# Altium schematic symbol library jlcpcb_2025_04_resistors_extended_2512.schlib: 2667 symbols (part 8 of 14) (continued)
## FRL2512FR100TS
designator R?  Resistance: 100mΩ  (hidden comment: *)
Resistor, 100mΩ, ±1%, 1W, 200V, ±200ppm/℃, -55℃~+155℃, SMD 2512; Manufacturer: Uniroyal; Manufacturer Part Number: FRL2512FR100TS; Supplier 1: LCSC; Supplier Part Number 1: C2960832; JLCPCB Part Number: C2960832; Power Rating: 1W; Category: Resistors; Package Size: 2512; JLCPCB Basic Part: Yes; Tolerance: ±1%; Voltage Rating: 200V; Temperature Coefficient: ±200ppm/℃; Temperature Rating: -55℃~+155℃; ComponentLink1Description: Datasheet; ComponentLink1URL: https://wmsc.lcsc.com/wmsc/upload/file/pdf/v2/lcsc/2201181800_FOJAN-FRL2512FR100TS_C2960832.pdf; ComponentLink2Description: JLCPCB Part URL; ComponentLink2URL: https://jlcpcb.com/partdetail/C2960832
pins: 1, 2
1 alternate drawing of the same symbol

## FRL2512FR110TS
designator R?  Resistance: 110mΩ  (hidden comment: *)
Resistor, 110mΩ, ±1%, 1W, 500V, ±600ppm/℃, -55℃~+155℃, SMD 2512; Manufacturer: Uniroyal; Manufacturer Part Number: FRL2512FR110TS; Supplier 1: LCSC; Supplier Part Number 1: C2960772; JLCPCB Part Number: C2960772; Power Rating: 1W; Category: Resistors; Package Size: 2512; JLCPCB Basic Part: Yes; Tolerance: ±1%; Voltage Rating: 500V; Temperature Coefficient: ±600ppm/℃; Temperature Rating: -55℃~+155℃; ComponentLink1Description: Datasheet; ComponentLink1URL: https://wmsc.lcsc.com/wmsc/upload/file/pdf/v2/lcsc/2201181800_FOJAN-FRL2512FR110TS_C2960772.pdf; ComponentLink2Description: JLCPCB Part URL; ComponentLink2URL: https://jlcpcb.com/partdetail/C2960772
pins: 1, 2
1 alternate drawing of the same symbol

## FRL2512FR120TS
designator R?  Resistance: 120mΩ  (hidden comment: *)
Resistor, 120mΩ, ±1%, 1W, 500V, ±600ppm/℃, -55℃~+155℃, SMD 2512; Manufacturer: Uniroyal; Manufacturer Part Number: FRL2512FR120TS; Supplier 1: LCSC; Supplier Part Number 1: C2934364; JLCPCB Part Number: C2934364; Power Rating: 1W; Category: Resistors; Package Size: 2512; JLCPCB Basic Part: Yes; Tolerance: ±1%; Voltage Rating: 500V; Temperature Coefficient: ±600ppm/℃; Temperature Rating: -55℃~+155℃; ComponentLink1Description: Datasheet; ComponentLink1URL: https://wmsc.lcsc.com/wmsc/upload/file/pdf/v2/lcsc/2308241947_FOJAN-FRL2512FR120TS_C2934364.pdf; ComponentLink2Description: JLCPCB Part URL; ComponentLink2URL: https://jlcpcb.com/partdetail/C2934364
pins: 1, 2
1 alternate drawing of the same symbol

## FRL2512FR150TS
designator R?  Resistance: 150mΩ  (hidden comment: *)
Resistor, 150mΩ, ±1%, 1W, 500V, ±600ppm/℃, -55℃~+155℃, SMD 2512; Manufacturer: Uniroyal; Manufacturer Part Number: FRL2512FR150TS; Supplier 1: LCSC; Supplier Part Number 1: C2960827; JLCPCB Part Number: C2960827; Power Rating: 1W; Category: Resistors; Package Size: 2512; JLCPCB Basic Part: Yes; Tolerance: ±1%; Voltage Rating: 500V; Temperature Coefficient: ±600ppm/℃; Temperature Rating: -55℃~+155℃; ComponentLink1Description: Datasheet; ComponentLink1URL: https://wmsc.lcsc.com/wmsc/upload/file/pdf/v2/lcsc/2201181800_FOJAN-FRL2512FR150TS_C2960827.pdf; ComponentLink2Description: JLCPCB Part URL; ComponentLink2URL: https://jlcpcb.com/partdetail/C2960827
pins: 1, 2
1 alternate drawing of the same symbol

## FRL2512FR180TS
designator R?  Resistance: 180mΩ  (hidden comment: *)
Resistor, 180mΩ, ±1%, 1W, 500V, ±600ppm/℃, -55℃~+155℃, SMD 2512; Manufacturer: Uniroyal; Manufacturer Part Number: FRL2512FR180TS; Supplier 1: LCSC; Supplier Part Number 1: C2934365; JLCPCB Part Number: C2934365; Power Rating: 1W; Category: Resistors; Package Size: 2512; JLCPCB Basic Part: Yes; Tolerance: ±1%; Voltage Rating: 500V; Temperature Coefficient: ±600ppm/℃; Temperature Rating: -55℃~+155℃; ComponentLink1Description: Datasheet; ComponentLink1URL: https://wmsc.lcsc.com/wmsc/upload/file/pdf/v2/lcsc/2308241947_FOJAN-FRL2512FR180TS_C2934365.pdf; ComponentLink2Description: JLCPCB Part URL; ComponentLink2URL: https://jlcpcb.com/partdetail/C2934365
pins: 1, 2
1 alternate drawing of the same symbol

## FRL2512FR200TS
designator R?  Resistance: 200mΩ  (hidden comment: *)
Resistor, 200mΩ, ±1%, 1W, 500V, ±600ppm/℃, -55℃~+155℃, SMD 2512; Manufacturer: Uniroyal; Manufacturer Part Number: FRL2512FR200TS; Supplier 1: LCSC; Supplier Part Number 1: C2934366; JLCPCB Part Number: C2934366; Power Rating: 1W; Category: Resistors; Package Size: 2512; JLCPCB Basic Part: Yes; Tolerance: ±1%; Voltage Rating: 500V; Temperature Coefficient: ±600ppm/℃; Temperature Rating: -55℃~+155℃; ComponentLink1Description: Datasheet; ComponentLink1URL: https://wmsc.lcsc.com/wmsc/upload/file/pdf/v2/lcsc/2308241947_FOJAN-FRL2512FR200TS_C2934366.pdf; ComponentLink2Description: JLCPCB Part URL; ComponentLink2URL: https://jlcpcb.com/partdetail/C2934366
pins: 1, 2
1 alternate drawing of the same symbol

## FRL2512FR220TS
designator R?  Resistance: 220mΩ  (hidden comment: *)
Resistor, 220mΩ, ±1%, 1W, 500V, ±300ppm/℃, -55℃~+155℃, SMD 2512; Manufacturer: Uniroyal; Manufacturer Part Number: FRL2512FR220TS; Supplier 1: LCSC; Supplier Part Number 1: C2960770; JLCPCB Part Number: C2960770; Power Rating: 1W; Category: Resistors; Package Size: 2512; JLCPCB Basic Part: Yes; Tolerance: ±1%; Voltage Rating: 500V; Temperature Coefficient: ±300ppm/℃; Temperature Rating: -55℃~+155℃; ComponentLink1Description: Datasheet; ComponentLink1URL: https://wmsc.lcsc.com/wmsc/upload/file/pdf/v2/lcsc/2201181800_FOJAN-FRL2512FR220TS_C2960770.pdf; ComponentLink2Description: JLCPCB Part URL; ComponentLink2URL: https://jlcpcb.com/partdetail/C2960770
pins: 1, 2
1 alternate drawing of the same symbol

## FRL2512FR240TS
designator R?  Resistance: 240mΩ  (hidden comment: *)
Resistor, 240mΩ, ±1%, 1W, 500V, ±300ppm/℃, -55℃~+155℃, SMD 2512; Manufacturer: Uniroyal; Manufacturer Part Number: FRL2512FR240TS; Supplier 1: LCSC; Supplier Part Number 1: C2934367; JLCPCB Part Number: C2934367; Power Rating: 1W; Category: Resistors; Package Size: 2512; JLCPCB Basic Part: Yes; Tolerance: ±1%; Voltage Rating: 500V; Temperature Coefficient: ±300ppm/℃; Temperature Rating: -55℃~+155℃; ComponentLink1Description: Datasheet; ComponentLink1URL: https://wmsc.lcsc.com/wmsc/upload/file/pdf/v2/lcsc/2308241947_FOJAN-FRL2512FR240TS_C2934367.pdf; ComponentLink2Description: JLCPCB Part URL; ComponentLink2URL: https://jlcpcb.com/partdetail/C2934367
pins: 1, 2
1 alternate drawing of the same symbol

## FRL2512FR250TS
designator R?  Resistance: 250mΩ  (hidden comment: *)
Resistor, 250mΩ, ±1%, SMD 2512; Manufacturer: Uniroyal; Manufacturer Part Number: FRL2512FR250TS; Supplier 1: LCSC; Supplier Part Number 1: C3000774; JLCPCB Part Number: C3000774; Category: Resistors; Package Size: 2512; JLCPCB Basic Part: Yes; Tolerance: ±1%; ComponentLink1Description: Datasheet; ComponentLink1URL: https://wmsc.lcsc.com/wmsc/upload/file/pdf/v2/lcsc/2308241947_FOJAN-FRL2512FR250TS_C3000774.pdf; ComponentLink2Description: JLCPCB Part URL; ComponentLink2URL: https://jlcpcb.com/partdetail/C3000774
pins: 1, 2
1 alternate drawing of the same symbol

## FRL2512FR270TS
designator R?  Resistance: 270mΩ  (hidden comment: *)
Resistor, 270mΩ, ±1%, 1W, 500V, ±300ppm/℃, -55℃~+155℃, SMD 2512; Manufacturer: Uniroyal; Manufacturer Part Number: FRL2512FR270TS; Supplier 1: LCSC; Supplier Part Number 1: C2960711; JLCPCB Part Number: C2960711; Power Rating: 1W; Category: Resistors; Package Size: 2512; JLCPCB Basic Part: Yes; Tolerance: ±1%; Voltage Rating: 500V; Temperature Coefficient: ±300ppm/℃; Temperature Rating: -55℃~+155℃; ComponentLink1Description: Datasheet; ComponentLink1URL: https://wmsc.lcsc.com/wmsc/upload/file/pdf/v2/lcsc/2201181800_FOJAN-FRL2512FR270TS_C2960711.pdf; ComponentLink2Description: JLCPCB Part URL; ComponentLink2URL: https://jlcpcb.com/partdetail/C2960711
pins: 1, 2
1 alternate drawing of the same symbol

## FRL2512FR330TS
designator R?  Resistance: 330mΩ  (hidden comment: *)
Resistor, 330mΩ, ±1%, 1W, 500V, ±300ppm/℃, -55℃~+155℃, SMD 2512; Manufacturer: Uniroyal; Manufacturer Part Number: FRL2512FR330TS; Supplier 1: LCSC; Supplier Part Number 1: C2960712; JLCPCB Part Number: C2960712; Power Rating: 1W; Category: Resistors; Package Size: 2512; JLCPCB Basic Part: Yes; Tolerance: ±1%; Voltage Rating: 500V; Temperature Coefficient: ±300ppm/℃; Temperature Rating: -55℃~+155℃; ComponentLink1Description: Datasheet; ComponentLink1URL: https://wmsc.lcsc.com/wmsc/upload/file/pdf/v2/lcsc/2201181800_FOJAN-FRL2512FR330TS_C2960712.pdf; ComponentLink2Description: JLCPCB Part URL; ComponentLink2URL: https://jlcpcb.com/partdetail/C2960712
pins: 1, 2
1 alternate drawing of the same symbol

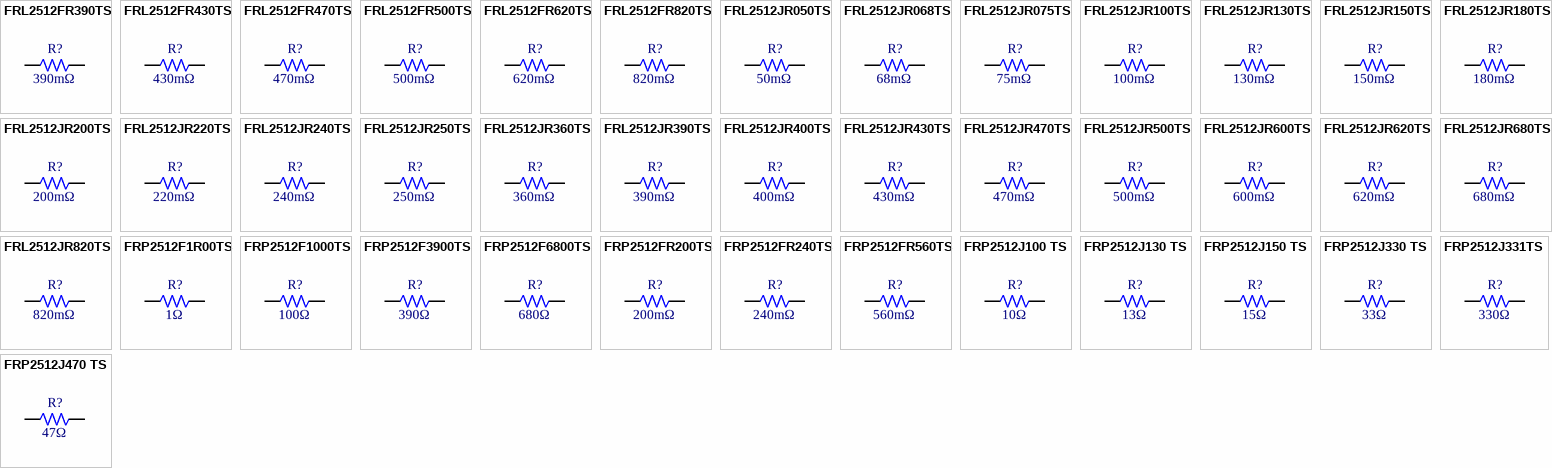
[diagram p36: symbols FRL2512FR390TS to FRP2512J470 TS]

## FRL2512FR390TS
designator R?  Resistance: 390mΩ  (hidden comment: *)
Resistor, 390mΩ, ±1%, 1W, 500V, ±300ppm/℃, -55℃~+155℃, SMD 2512; Manufacturer: Uniroyal; Manufacturer Part Number: FRL2512FR390TS; Supplier 1: LCSC; Supplier Part Number 1: C2960754; JLCPCB Part Number: C2960754; Power Rating: 1W; Category: Resistors; Package Size: 2512; JLCPCB Basic Part: Yes; Tolerance: ±1%; Voltage Rating: 500V; Temperature Coefficient: ±300ppm/℃; Temperature Rating: -55℃~+155℃; ComponentLink1Description: Datasheet; ComponentLink1URL: https://wmsc.lcsc.com/wmsc/upload/file/pdf/v2/lcsc/2201181800_FOJAN-FRL2512FR390TS_C2960754.pdf; ComponentLink2Description: JLCPCB Part URL; ComponentLink2URL: https://jlcpcb.com/partdetail/C2960754
pins: 1, 2
1 alternate drawing of the same symbol

## FRL2512FR430TS
designator R?  Resistance: 430mΩ  (hidden comment: *)
Resistor, 430mΩ, ±1%, 1W, 500V, ±300ppm/℃, -55℃~+155℃, SMD 2512; Manufacturer: Uniroyal; Manufacturer Part Number: FRL2512FR430TS; Supplier 1: LCSC; Supplier Part Number 1: C2960834; JLCPCB Part Number: C2960834; Power Rating: 1W; Category: Resistors; Package Size: 2512; JLCPCB Basic Part: Yes; Tolerance: ±1%; Voltage Rating: 500V; Temperature Coefficient: ±300ppm/℃; Temperature Rating: -55℃~+155℃; ComponentLink1Description: Datasheet; ComponentLink1URL: https://wmsc.lcsc.com/wmsc/upload/file/pdf/v2/lcsc/2201181800_FOJAN-FRL2512FR430TS_C2960834.pdf; ComponentLink2Description: JLCPCB Part URL; ComponentLink2URL: https://jlcpcb.com/partdetail/C2960834
pins: 1, 2
1 alternate drawing of the same symbol

## FRL2512FR470TS
designator R?  Resistance: 470mΩ  (hidden comment: *)
Resistor, 470mΩ, ±1%, 1W, 500V, ±300ppm/℃, -55℃~+155℃, SMD 2512; Manufacturer: Uniroyal; Manufacturer Part Number: FRL2512FR470TS; Supplier 1: LCSC; Supplier Part Number 1: C2934368; JLCPCB Part Number: C2934368; Power Rating: 1W; Category: Resistors; Package Size: 2512; JLCPCB Basic Part: Yes; Tolerance: ±1%; Voltage Rating: 500V; Temperature Coefficient: ±300ppm/℃; Temperature Rating: -55℃~+155℃; ComponentLink1Description: Datasheet; ComponentLink1URL: https://wmsc.lcsc.com/wmsc/upload/file/pdf/v2/lcsc/2308241947_FOJAN-FRL2512FR470TS_C2934368.pdf; ComponentLink2Description: JLCPCB Part URL; ComponentLink2URL: https://jlcpcb.com/partdetail/C2934368
pins: 1, 2
1 alternate drawing of the same symbol

## FRL2512FR500TS
designator R?  Resistance: 500mΩ  (hidden comment: *)
Resistor, 500mΩ, ±1%, 1W, 500V, ±300ppm/℃, -55℃~+155℃, SMD 2512; Manufacturer: Uniroyal; Manufacturer Part Number: FRL2512FR500TS; Supplier 1: LCSC; Supplier Part Number 1: C2934369; JLCPCB Part Number: C2934369; Power Rating: 1W; Category: Resistors; Package Size: 2512; JLCPCB Basic Part: Yes; Tolerance: ±1%; Voltage Rating: 500V; Temperature Coefficient: ±300ppm/℃; Temperature Rating: -55℃~+155℃; ComponentLink1Description: Datasheet; ComponentLink1URL: https://wmsc.lcsc.com/wmsc/upload/file/pdf/v2/lcsc/2308241947_FOJAN-FRL2512FR500TS_C2934369.pdf; ComponentLink2Description: JLCPCB Part URL; ComponentLink2URL: https://jlcpcb.com/partdetail/C2934369
pins: 1, 2
1 alternate drawing of the same symbol

## FRL2512FR620TS
designator R?  Resistance: 620mΩ  (hidden comment: *)
Resistor, 620mΩ, ±1%, 1W, ±200ppm/℃, SMD 2512; Manufacturer: Uniroyal; Manufacturer Part Number: FRL2512FR620TS; Supplier 1: LCSC; Supplier Part Number 1: C5126252; JLCPCB Part Number: C5126252; Power Rating: 1W; Category: Resistors; Package Size: 2512; JLCPCB Basic Part: Yes; Tolerance: ±1%; Temperature Coefficient: ±200ppm/℃; ComponentLink1Description: Datasheet; ComponentLink1URL: https://wmsc.lcsc.com/wmsc/upload/file/pdf/v2/lcsc/2308241947_FOJAN-FRL2512FR620TS_C5126252.pdf; ComponentLink2Description: JLCPCB Part URL; ComponentLink2URL: https://jlcpcb.com/partdetail/C5126252
pins: 1, 2
1 alternate drawing of the same symbol

## FRL2512FR820TS
designator R?  Resistance: 820mΩ  (hidden comment: *)
Resistor, 820mΩ, ±1%, 1W, 500V, ±200ppm/℃, -55℃~+155℃, SMD 2512; Manufacturer: Uniroyal; Manufacturer Part Number: FRL2512FR820TS; Supplier 1: LCSC; Supplier Part Number 1: C2960726; JLCPCB Part Number: C2960726; Power Rating: 1W; Category: Resistors; Package Size: 2512; JLCPCB Basic Part: Yes; Tolerance: ±1%; Voltage Rating: 500V; Temperature Coefficient: ±200ppm/℃; Temperature Rating: -55℃~+155℃; ComponentLink1Description: Datasheet; ComponentLink1URL: https://wmsc.lcsc.com/wmsc/upload/file/pdf/v2/lcsc/2201181800_FOJAN-FRL2512FR820TS_C2960726.pdf; ComponentLink2Description: JLCPCB Part URL; ComponentLink2URL: https://jlcpcb.com/partdetail/C2960726
pins: 1, 2
1 alternate drawing of the same symbol

## FRL2512JR050TS
designator R?  Resistance: 50mΩ  (hidden comment: *)
Resistor, 50mΩ, ±5%, 1W, 500V, ±1200ppm/℃, SMD 2512; Manufacturer: Uniroyal; Manufacturer Part Number: FRL2512JR050TS; Supplier 1: LCSC; Supplier Part Number 1: C3000641; JLCPCB Part Number: C3000641; Power Rating: 1W; Category: Resistors; Package Size: 2512; JLCPCB Basic Part: Yes; Tolerance: ±5%; Voltage Rating: 500V; Temperature Coefficient: ±1200ppm/℃; ComponentLink1Description: Datasheet; ComponentLink1URL: https://wmsc.lcsc.com/wmsc/upload/file/pdf/v2/lcsc/2308241947_FOJAN-FRL2512JR050TS_C3000641.pdf; ComponentLink2Description: JLCPCB Part URL; ComponentLink2URL: https://jlcpcb.com/partdetail/C3000641
pins: 1, 2
1 alternate drawing of the same symbol

## FRL2512JR068TS
designator R?  Resistance: 68mΩ  (hidden comment: *)
Resistor, 68mΩ, ±5%, 1W, 500V, ±600ppm/℃, SMD 2512; Manufacturer: Uniroyal; Manufacturer Part Number: FRL2512JR068TS; Supplier 1: LCSC; Supplier Part Number 1: C3000683; JLCPCB Part Number: C3000683; Power Rating: 1W; Category: Resistors; Package Size: 2512; JLCPCB Basic Part: Yes; Tolerance: ±5%; Voltage Rating: 500V; Temperature Coefficient: ±600ppm/℃; ComponentLink1Description: Datasheet; ComponentLink1URL: https://wmsc.lcsc.com/wmsc/upload/file/pdf/v2/lcsc/2308241947_FOJAN-FRL2512JR068TS_C3000683.pdf; ComponentLink2Description: JLCPCB Part URL; ComponentLink2URL: https://jlcpcb.com/partdetail/C3000683
pins: 1, 2
1 alternate drawing of the same symbol

## FRL2512JR075TS
designator R?  Resistance: 75mΩ  (hidden comment: *)
Resistor, 75mΩ, ±5%, 1W, 500V, ±600ppm/℃, SMD 2512; Manufacturer: Uniroyal; Manufacturer Part Number: FRL2512JR075TS; Supplier 1: LCSC; Supplier Part Number 1: C3000715; JLCPCB Part Number: C3000715; Power Rating: 1W; Category: Resistors; Package Size: 2512; JLCPCB Basic Part: Yes; Tolerance: ±5%; Voltage Rating: 500V; Temperature Coefficient: ±600ppm/℃; ComponentLink1Description: Datasheet; ComponentLink1URL: https://wmsc.lcsc.com/wmsc/upload/file/pdf/v2/lcsc/2308241947_FOJAN-FRL2512JR075TS_C3000715.pdf; ComponentLink2Description: JLCPCB Part URL; ComponentLink2URL: https://jlcpcb.com/partdetail/C3000715
pins: 1, 2
1 alternate drawing of the same symbol

## FRL2512JR100TS
designator R?  Resistance: 100mΩ  (hidden comment: *)
Resistor, 100mΩ, ±5%, 1W, 500V, ±600ppm/℃, -55℃~+155℃, SMD 2512; Manufacturer: Uniroyal; Manufacturer Part Number: FRL2512JR100TS; Supplier 1: LCSC; Supplier Part Number 1: C2907566; JLCPCB Part Number: C2907566; Power Rating: 1W; Category: Resistors; Package Size: 2512; JLCPCB Basic Part: Yes; Tolerance: ±5%; Voltage Rating: 500V; Temperature Coefficient: ±600ppm/℃; Temperature Rating: -55℃~+155℃; ComponentLink1Description: Datasheet; ComponentLink1URL: https://wmsc.lcsc.com/wmsc/upload/file/pdf/v2/lcsc/2308241009_FOJAN-FRL2512JR100TS_C2907566.pdf; ComponentLink2Description: JLCPCB Part URL; ComponentLink2URL: https://jlcpcb.com/partdetail/C2907566
pins: 1, 2
1 alternate drawing of the same symbol

## FRL2512JR130TS
designator R?  Resistance: 130mΩ  (hidden comment: *)
Resistor, 130mΩ, ±5%, 1W, 500V, ±600ppm/℃, -55℃~+155℃, SMD 2512; Manufacturer: Uniroyal; Manufacturer Part Number: FRL2512JR130TS; Supplier 1: LCSC; Supplier Part Number 1: C2934370; JLCPCB Part Number: C2934370; Power Rating: 1W; Category: Resistors; Package Size: 2512; JLCPCB Basic Part: Yes; Tolerance: ±5%; Voltage Rating: 500V; Temperature Coefficient: ±600ppm/℃; Temperature Rating: -55℃~+155℃; ComponentLink1Description: Datasheet; ComponentLink1URL: https://wmsc.lcsc.com/wmsc/upload/file/pdf/v2/lcsc/2308241947_FOJAN-FRL2512JR130TS_C2934370.pdf; ComponentLink2Description: JLCPCB Part URL; ComponentLink2URL: https://jlcpcb.com/partdetail/C2934370
pins: 1, 2
1 alternate drawing of the same symbol

## FRL2512JR150TS
designator R?  Resistance: 150mΩ  (hidden comment: *)
Resistor, 150mΩ, ±5%, 1W, 500V, ±600ppm/℃, -55℃~+155℃, SMD 2512; Manufacturer: Uniroyal; Manufacturer Part Number: FRL2512JR150TS; Supplier 1: LCSC; Supplier Part Number 1: C2934371; JLCPCB Part Number: C2934371; Power Rating: 1W; Category: Resistors; Package Size: 2512; JLCPCB Basic Part: Yes; Tolerance: ±5%; Voltage Rating: 500V; Temperature Coefficient: ±600ppm/℃; Temperature Rating: -55℃~+155℃; ComponentLink1Description: Datasheet; ComponentLink1URL: https://wmsc.lcsc.com/wmsc/upload/file/pdf/v2/lcsc/2308241947_FOJAN-FRL2512JR150TS_C2934371.pdf; ComponentLink2Description: JLCPCB Part URL; ComponentLink2URL: https://jlcpcb.com/partdetail/C2934371
pins: 1, 2
1 alternate drawing of the same symbol

## FRL2512JR180TS
designator R?  Resistance: 180mΩ  (hidden comment: *)
Resistor, 180mΩ, ±5%, 1W, 500V, ±600ppm/℃, -55℃~+155℃, SMD 2512; Manufacturer: Uniroyal; Manufacturer Part Number: FRL2512JR180TS; Supplier 1: LCSC; Supplier Part Number 1: C2934372; JLCPCB Part Number: C2934372; Power Rating: 1W; Category: Resistors; Package Size: 2512; JLCPCB Basic Part: Yes; Tolerance: ±5%; Voltage Rating: 500V; Temperature Coefficient: ±600ppm/℃; Temperature Rating: -55℃~+155℃; ComponentLink1Description: Datasheet; ComponentLink2Description: JLCPCB Part URL; ComponentLink2URL: https://jlcpcb.com/partdetail/C2934372
pins: 1, 2
1 alternate drawing of the same symbol

## FRL2512JR200TS
designator R?  Resistance: 200mΩ  (hidden comment: *)
Resistor, 200mΩ, ±5%, 1W, 200V, ±600ppm/℃, -55℃~+155℃, SMD 2512; Manufacturer: Uniroyal; Manufacturer Part Number: FRL2512JR200TS; Supplier 1: LCSC; Supplier Part Number 1: C2934373; JLCPCB Part Number: C2934373; Power Rating: 1W; Category: Resistors; Package Size: 2512; JLCPCB Basic Part: Yes; Tolerance: ±5%; Voltage Rating: 200V; Temperature Coefficient: ±600ppm/℃; Temperature Rating: -55℃~+155℃; ComponentLink1Description: Datasheet; ComponentLink1URL: https://wmsc.lcsc.com/wmsc/upload/file/pdf/v2/lcsc/2308241947_FOJAN-FRL2512JR200TS_C2934373.pdf; ComponentLink2Description: JLCPCB Part URL; ComponentLink2URL: https://jlcpcb.com/partdetail/C2934373
pins: 1, 2
1 alternate drawing of the same symbol

## FRL2512JR220TS
designator R?  Resistance: 220mΩ  (hidden comment: *)
Resistor, 220mΩ, ±5%, 1W, 500V, ±300ppm/℃, -55℃~+155℃, SMD 2512; Manufacturer: Uniroyal; Manufacturer Part Number: FRL2512JR220TS; Supplier 1: LCSC; Supplier Part Number 1: C2934374; JLCPCB Part Number: C2934374; Power Rating: 1W; Category: Resistors; Package Size: 2512; JLCPCB Basic Part: Yes; Tolerance: ±5%; Voltage Rating: 500V; Temperature Coefficient: ±300ppm/℃; Temperature Rating: -55℃~+155℃; ComponentLink1Description: Datasheet; ComponentLink1URL: https://wmsc.lcsc.com/wmsc/upload/file/pdf/v2/lcsc/2203092030_FOJAN-FRL2512JR220TS_C2934374.pdf; ComponentLink2Description: JLCPCB Part URL; ComponentLink2URL: https://jlcpcb.com/partdetail/C2934374
pins: 1, 2
1 alternate drawing of the same symbol

## FRL2512JR240TS
designator R?  Resistance: 240mΩ  (hidden comment: *)
Resistor, 240mΩ, ±5%, 1W, 500V, ±200ppm/℃, -55℃~+155℃, SMD 2512; Manufacturer: Uniroyal; Manufacturer Part Number: FRL2512JR240TS; Supplier 1: LCSC; Supplier Part Number 1: C2960776; JLCPCB Part Number: C2960776; Power Rating: 1W; Category: Resistors; Package Size: 2512; JLCPCB Basic Part: Yes; Tolerance: ±5%; Voltage Rating: 500V; Temperature Coefficient: ±200ppm/℃; Temperature Rating: -55℃~+155℃; ComponentLink1Description: Datasheet; ComponentLink1URL: https://wmsc.lcsc.com/wmsc/upload/file/pdf/v2/lcsc/2201181800_FOJAN-FRL2512JR240TS_C2960776.pdf; ComponentLink2Description: JLCPCB Part URL; ComponentLink2URL: https://jlcpcb.com/partdetail/C2960776
pins: 1, 2
1 alternate drawing of the same symbol

## FRL2512JR250TS
designator R?  Resistance: 250mΩ  (hidden comment: *)
Resistor, 250mΩ, ±5%, 1W, 500V, ±300ppm/℃, -55℃~+155℃, SMD 2512; Manufacturer: Uniroyal; Manufacturer Part Number: FRL2512JR250TS; Supplier 1: LCSC; Supplier Part Number 1: C2934375; JLCPCB Part Number: C2934375; Power Rating: 1W; Category: Resistors; Package Size: 2512; JLCPCB Basic Part: Yes; Tolerance: ±5%; Voltage Rating: 500V; Temperature Coefficient: ±300ppm/℃; Temperature Rating: -55℃~+155℃; ComponentLink1Description: Datasheet; ComponentLink1URL: https://wmsc.lcsc.com/wmsc/upload/file/pdf/v2/lcsc/2201251530_FOJAN-FRL2512JR250TS_C2934375.pdf; ComponentLink2Description: JLCPCB Part URL; ComponentLink2URL: https://jlcpcb.com/partdetail/C2934375
pins: 1, 2
1 alternate drawing of the same symbol

## FRL2512JR360TS
designator R?  Resistance: 360mΩ  (hidden comment: *)
Resistor, 360mΩ, ±5%, 1W, 500V, ±300ppm/℃, -55℃~+155℃, SMD 2512; Manufacturer: Uniroyal; Manufacturer Part Number: FRL2512JR360TS; Supplier 1: LCSC; Supplier Part Number 1: C2934379; JLCPCB Part Number: C2934379; Power Rating: 1W; Category: Resistors; Package Size: 2512; JLCPCB Basic Part: Yes; Tolerance: ±5%; Voltage Rating: 500V; Temperature Coefficient: ±300ppm/℃; Temperature Rating: -55℃~+155℃; ComponentLink1Description: Datasheet; ComponentLink1URL: https://wmsc.lcsc.com/wmsc/upload/file/pdf/v2/lcsc/2308241947_FOJAN-FRL2512JR360TS_C2934379.pdf; ComponentLink2Description: JLCPCB Part URL; ComponentLink2URL: https://jlcpcb.com/partdetail/C2934379
pins: 1, 2
1 alternate drawing of the same symbol

## FRL2512JR390TS
designator R?  Resistance: 390mΩ  (hidden comment: *)
Resistor, 390mΩ, ±5%, 1W, 500V, ±300ppm/℃, -55℃~+155℃, SMD 2512; Manufacturer: Uniroyal; Manufacturer Part Number: FRL2512JR390TS; Supplier 1: LCSC; Supplier Part Number 1: C2934380; JLCPCB Part Number: C2934380; Power Rating: 1W; Category: Resistors; Package Size: 2512; JLCPCB Basic Part: Yes; Tolerance: ±5%; Voltage Rating: 500V; Temperature Coefficient: ±300ppm/℃; Temperature Rating: -55℃~+155℃; ComponentLink1Description: Datasheet; ComponentLink1URL: https://wmsc.lcsc.com/wmsc/upload/file/pdf/v2/lcsc/2308241947_FOJAN-FRL2512JR390TS_C2934380.pdf; ComponentLink2Description: JLCPCB Part URL; ComponentLink2URL: https://jlcpcb.com/partdetail/C2934380
pins: 1, 2
1 alternate drawing of the same symbol

## FRL2512JR400TS
designator R?  Resistance: 400mΩ  (hidden comment: *)
Resistor, 400mΩ, ±5%, 1W, 500V, ±300ppm/℃, -55℃~+155℃, SMD 2512; Manufacturer: Uniroyal; Manufacturer Part Number: FRL2512JR400TS; Supplier 1: LCSC; Supplier Part Number 1: C2960851; JLCPCB Part Number: C2960851; Power Rating: 1W; Category: Resistors; Package Size: 2512; JLCPCB Basic Part: Yes; Tolerance: ±5%; Voltage Rating: 500V; Temperature Coefficient: ±300ppm/℃; Temperature Rating: -55℃~+155℃; ComponentLink1Description: Datasheet; ComponentLink1URL: https://wmsc.lcsc.com/wmsc/upload/file/pdf/v2/lcsc/2201181800_FOJAN-FRL2512JR400TS_C2960851.pdf; ComponentLink2Description: JLCPCB Part URL; ComponentLink2URL: https://jlcpcb.com/partdetail/C2960851
pins: 1, 2
1 alternate drawing of the same symbol

## FRL2512JR430TS
designator R?  Resistance: 430mΩ  (hidden comment: *)
Resistor, 430mΩ, ±5%, 1W, 500V, ±300ppm/℃, SMD 2512; Manufacturer: Uniroyal; Manufacturer Part Number: FRL2512JR430TS; Supplier 1: LCSC; Supplier Part Number 1: C3000795; JLCPCB Part Number: C3000795; Power Rating: 1W; Category: Resistors; Package Size: 2512; JLCPCB Basic Part: Yes; Tolerance: ±5%; Voltage Rating: 500V; Temperature Coefficient: ±300ppm/℃; ComponentLink1Description: Datasheet; ComponentLink1URL: https://wmsc.lcsc.com/wmsc/upload/file/pdf/v2/lcsc/2308241947_FOJAN-FRL2512JR430TS_C3000795.pdf; ComponentLink2Description: JLCPCB Part URL; ComponentLink2URL: https://jlcpcb.com/partdetail/C3000795
pins: 1, 2
1 alternate drawing of the same symbol

## FRL2512JR470TS
designator R?  Resistance: 470mΩ  (hidden comment: *)
Resistor, 470mΩ, ±5%, 1W, 500V, ±300ppm/℃, -55℃~+155℃, SMD 2512; Manufacturer: Uniroyal; Manufacturer Part Number: FRL2512JR470TS; Supplier 1: LCSC; Supplier Part Number 1: C2934381; JLCPCB Part Number: C2934381; Power Rating: 1W; Category: Resistors; Package Size: 2512; JLCPCB Basic Part: Yes; Tolerance: ±5%; Voltage Rating: 500V; Temperature Coefficient: ±300ppm/℃; Temperature Rating: -55℃~+155℃; ComponentLink1Description: Datasheet; ComponentLink1URL: https://wmsc.lcsc.com/wmsc/upload/file/pdf/v2/lcsc/2308241947_FOJAN-FRL2512JR470TS_C2934381.pdf; ComponentLink2Description: JLCPCB Part URL; ComponentLink2URL: https://jlcpcb.com/partdetail/C2934381
pins: 1, 2
1 alternate drawing of the same symbol

## FRL2512JR500TS
designator R?  Resistance: 500mΩ  (hidden comment: *)
Resistor, 500mΩ, ±5%, 1W, 500V, ±300ppm/℃, -55℃~+155℃, SMD 2512; Manufacturer: Uniroyal; Manufacturer Part Number: FRL2512JR500TS; Supplier 1: LCSC; Supplier Part Number 1: C2934382; JLCPCB Part Number: C2934382; Power Rating: 1W; Category: Resistors; Package Size: 2512; JLCPCB Basic Part: Yes; Tolerance: ±5%; Voltage Rating: 500V; Temperature Coefficient: ±300ppm/℃; Temperature Rating: -55℃~+155℃; ComponentLink1Description: Datasheet; ComponentLink1URL: https://wmsc.lcsc.com/wmsc/upload/file/pdf/v2/lcsc/2308241947_FOJAN-FRL2512JR500TS_C2934382.pdf; ComponentLink2Description: JLCPCB Part URL; ComponentLink2URL: https://jlcpcb.com/partdetail/C2934382
pins: 1, 2
1 alternate drawing of the same symbol

## FRL2512JR600TS
designator R?  Resistance: 600mΩ  (hidden comment: *)
Resistor, 600mΩ, ±5%, 1W, ±200ppm/℃, SMD 2512; Manufacturer: Uniroyal; Manufacturer Part Number: FRL2512JR600TS; Supplier 1: LCSC; Supplier Part Number 1: C7467376; JLCPCB Part Number: C7467376; Power Rating: 1W; Category: Resistors; Package Size: 2512; JLCPCB Basic Part: Yes; Tolerance: ±5%; Temperature Coefficient: ±200ppm/℃; ComponentLink1Description: Datasheet; ComponentLink2Description: JLCPCB Part URL; ComponentLink2URL: https://jlcpcb.com/partdetail/C7467376
pins: 1, 2
1 alternate drawing of the same symbol

## FRL2512JR620TS
designator R?  Resistance: 620mΩ  (hidden comment: *)
Resistor, 620mΩ, ±5%, 1W, 500V, ±200ppm/℃, -55℃~+155℃, SMD 2512; Manufacturer: Uniroyal; Manufacturer Part Number: FRL2512JR620TS; Supplier 1: LCSC; Supplier Part Number 1: C2934383; JLCPCB Part Number: C2934383; Power Rating: 1W; Category: Resistors; Package Size: 2512; JLCPCB Basic Part: Yes; Tolerance: ±5%; Voltage Rating: 500V; Temperature Coefficient: ±200ppm/℃; Temperature Rating: -55℃~+155℃; ComponentLink1Description: Datasheet; ComponentLink1URL: https://wmsc.lcsc.com/wmsc/upload/file/pdf/v2/lcsc/2308241947_FOJAN-FRL2512JR620TS_C2934383.pdf; ComponentLink2Description: JLCPCB Part URL; ComponentLink2URL: https://jlcpcb.com/partdetail/C2934383
pins: 1, 2
1 alternate drawing of the same symbol

## FRL2512JR680TS
designator R?  Resistance: 680mΩ  (hidden comment: *)
Resistor, 680mΩ, ±5%, 1W, 500V, ±200ppm/℃, -55℃~+155℃, SMD 2512; Manufacturer: Uniroyal; Manufacturer Part Number: FRL2512JR680TS; Supplier 1: LCSC; Supplier Part Number 1: C2934384; JLCPCB Part Number: C2934384; Power Rating: 1W; Category: Resistors; Package Size: 2512; JLCPCB Basic Part: Yes; Tolerance: ±5%; Voltage Rating: 500V; Temperature Coefficient: ±200ppm/℃; Temperature Rating: -55℃~+155℃; ComponentLink1Description: Datasheet; ComponentLink1URL: https://wmsc.lcsc.com/wmsc/upload/file/pdf/v2/lcsc/2308241947_FOJAN-FRL2512JR680TS_C2934384.pdf; ComponentLink2Description: JLCPCB Part URL; ComponentLink2URL: https://jlcpcb.com/partdetail/C2934384
pins: 1, 2
1 alternate drawing of the same symbol

## FRL2512JR820TS
designator R?  Resistance: 820mΩ  (hidden comment: *)
Resistor, 820mΩ, ±5%, 1W, 500V, ±200ppm/℃, -55℃~+155℃, SMD 2512; Manufacturer: Uniroyal; Manufacturer Part Number: FRL2512JR820TS; Supplier 1: LCSC; Supplier Part Number 1: C2934386; JLCPCB Part Number: C2934386; Power Rating: 1W; Category: Resistors; Package Size: 2512; JLCPCB Basic Part: Yes; Tolerance: ±5%; Voltage Rating: 500V; Temperature Coefficient: ±200ppm/℃; Temperature Rating: -55℃~+155℃; ComponentLink1Description: Datasheet; ComponentLink1URL: https://wmsc.lcsc.com/wmsc/upload/file/pdf/v2/lcsc/2308241947_FOJAN-FRL2512JR820TS_C2934386.pdf; ComponentLink2Description: JLCPCB Part URL; ComponentLink2URL: https://jlcpcb.com/partdetail/C2934386
pins: 1, 2
1 alternate drawing of the same symbol

## FRP2512F1R00TS
designator R?  Resistance: 1Ω  (hidden comment: *)
Resistor, 1Ω, ±1%, 2W, 200V, ±200ppm/℃, SMD 2512; Manufacturer: Uniroyal; Manufacturer Part Number: FRP2512F1R00TS; Supplier 1: LCSC; Supplier Part Number 1: C5713424; JLCPCB Part Number: C5713424; Power Rating: 2W; Category: Resistors; Package Size: 2512; JLCPCB Basic Part: Yes; Tolerance: ±1%; Voltage Rating: 200V; Temperature Coefficient: ±200ppm/℃; ComponentLink1Description: Datasheet; ComponentLink1URL: https://wmsc.lcsc.com/wmsc/upload/file/pdf/v2/lcsc/2308241947_FOJAN-FRP2512F1R00TS_C5713424.pdf; ComponentLink2Description: JLCPCB Part URL; ComponentLink2URL: https://jlcpcb.com/partdetail/C5713424
pins: 1, 2
1 alternate drawing of the same symbol

## FRP2512F1000TS
designator R?  Resistance: 100Ω  (hidden comment: *)
Resistor, 100Ω, ±1%, 2W, ±200ppm/℃, SMD 2512; Manufacturer: Uniroyal; Manufacturer Part Number: FRP2512F1000TS; Supplier 1: LCSC; Supplier Part Number 1: C5126189; JLCPCB Part Number: C5126189; Power Rating: 2W; Category: Resistors; Package Size: 2512; JLCPCB Basic Part: Yes; Tolerance: ±1%; Temperature Coefficient: ±200ppm/℃; ComponentLink1Description: Datasheet; ComponentLink1URL: https://wmsc.lcsc.com/wmsc/upload/file/pdf/v2/lcsc/2308241947_FOJAN-FRP2512F1000TS_C5126189.pdf; ComponentLink2Description: JLCPCB Part URL; ComponentLink2URL: https://jlcpcb.com/partdetail/C5126189
pins: 1, 2
1 alternate drawing of the same symbol

## FRP2512F3900TS
designator R?  Resistance: 390Ω  (hidden comment: *)
Resistor, 390Ω, ±1%, 2W, 200V, ±200ppm/℃, SMD 2512; Manufacturer: Uniroyal; Manufacturer Part Number: FRP2512F3900TS; Supplier 1: LCSC; Supplier Part Number 1: C3013381; JLCPCB Part Number: C3013381; Power Rating: 2W; Category: Resistors; Package Size: 2512; JLCPCB Basic Part: Yes; Tolerance: ±1%; Voltage Rating: 200V; Temperature Coefficient: ±200ppm/℃; ComponentLink1Description: Datasheet; ComponentLink1URL: https://wmsc.lcsc.com/wmsc/upload/file/pdf/v2/lcsc/2308241947_FOJAN-FRP2512F3900TS_C3013381.pdf; ComponentLink2Description: JLCPCB Part URL; ComponentLink2URL: https://jlcpcb.com/partdetail/C3013381
pins: 1, 2
1 alternate drawing of the same symbol

## FRP2512F6800TS
designator R?  Resistance: 680Ω  (hidden comment: *)
Resistor, 680Ω, ±1%, 2W, 200V, ±200ppm/℃, SMD 2512; Manufacturer: Uniroyal; Manufacturer Part Number: FRP2512F6800TS; Supplier 1: LCSC; Supplier Part Number 1: C3013382; JLCPCB Part Number: C3013382; Power Rating: 2W; Category: Resistors; Package Size: 2512; JLCPCB Basic Part: Yes; Tolerance: ±1%; Voltage Rating: 200V; Temperature Coefficient: ±200ppm/℃; ComponentLink1Description: Datasheet; ComponentLink1URL: https://wmsc.lcsc.com/wmsc/upload/file/pdf/v2/lcsc/2308241947_FOJAN-FRP2512F6800TS_C3013382.pdf; ComponentLink2Description: JLCPCB Part URL; ComponentLink2URL: https://jlcpcb.com/partdetail/C3013382
pins: 1, 2
1 alternate drawing of the same symbol

## FRP2512FR200TS
designator R?  Resistance: 200mΩ  (hidden comment: *)
Resistor, 200mΩ, ±1%, 2W, 200V, ±200ppm/℃, SMD 2512; Manufacturer: Uniroyal; Manufacturer Part Number: FRP2512FR200TS; Supplier 1: LCSC; Supplier Part Number 1: C3013383; JLCPCB Part Number: C3013383; Power Rating: 2W; Category: Resistors; Package Size: 2512; JLCPCB Basic Part: Yes; Tolerance: ±1%; Voltage Rating: 200V; Temperature Coefficient: ±200ppm/℃; ComponentLink1Description: Datasheet; ComponentLink1URL: https://wmsc.lcsc.com/wmsc/upload/file/pdf/v2/lcsc/2308241947_FOJAN-FRP2512FR200TS_C3013383.pdf; ComponentLink2Description: JLCPCB Part URL; ComponentLink2URL: https://jlcpcb.com/partdetail/C3013383
pins: 1, 2
1 alternate drawing of the same symbol

## FRP2512FR240TS
designator R?  Resistance: 240mΩ  (hidden comment: *)
Resistor, 240mΩ, ±1%, 2W, 200V, ±200ppm/℃, SMD 2512; Manufacturer: Uniroyal; Manufacturer Part Number: FRP2512FR240TS; Supplier 1: LCSC; Supplier Part Number 1: C3013384; JLCPCB Part Number: C3013384; Power Rating: 2W; Category: Resistors; Package Size: 2512; JLCPCB Basic Part: Yes; Tolerance: ±1%; Voltage Rating: 200V; Temperature Coefficient: ±200ppm/℃; ComponentLink1Description: Datasheet; ComponentLink1URL: https://wmsc.lcsc.com/wmsc/upload/file/pdf/v2/lcsc/2308241947_FOJAN-FRP2512FR240TS_C3013384.pdf; ComponentLink2Description: JLCPCB Part URL; ComponentLink2URL: https://jlcpcb.com/partdetail/C3013384
pins: 1, 2
1 alternate drawing of the same symbol

## FRP2512FR560TS
designator R?  Resistance: 560mΩ  (hidden comment: *)
Resistor, 560mΩ, ±1%, 2W, 200V, ±200ppm/℃, SMD 2512; Manufacturer: Uniroyal; Manufacturer Part Number: FRP2512FR560TS; Supplier 1: LCSC; Supplier Part Number 1: C2999550; JLCPCB Part Number: C2999550; Power Rating: 2W; Category: Resistors; Package Size: 2512; JLCPCB Basic Part: Yes; Tolerance: ±1%; Voltage Rating: 200V; Temperature Coefficient: ±200ppm/℃; ComponentLink1Description: Datasheet; ComponentLink1URL: https://wmsc.lcsc.com/wmsc/upload/file/pdf/v2/lcsc/2308241947_FOJAN-FRP2512FR560TS_C2999550.pdf; ComponentLink2Description: JLCPCB Part URL; ComponentLink2URL: https://jlcpcb.com/partdetail/C2999550
pins: 1, 2
1 alternate drawing of the same symbol

## FRP2512J100 TS
designator R?  Resistance: 10Ω  (hidden comment: *)
Resistor, 10Ω, ±5%, 2W, 200V, ±200ppm/℃, SMD 2512; Manufacturer: Uniroyal; Manufacturer Part Number: FRP2512J100 TS; Supplier 1: LCSC; Supplier Part Number 1: C3013385; JLCPCB Part Number: C3013385; Power Rating: 2W; Category: Resistors; Package Size: 2512; JLCPCB Basic Part: Yes; Tolerance: ±5%; Voltage Rating: 200V; Temperature Coefficient: ±200ppm/℃; ComponentLink1Description: Datasheet; ComponentLink1URL: https://wmsc.lcsc.com/wmsc/upload/file/pdf/v2/lcsc/2308241947_FOJAN-FRP2512J100-TS_C3013385.pdf; ComponentLink2Description: JLCPCB Part URL; ComponentLink2URL: https://jlcpcb.com/partdetail/C3013385
pins: 1, 2
1 alternate drawing of the same symbol

## FRP2512J130 TS
designator R?  Resistance: 13Ω  (hidden comment: *)
Resistor, 13Ω, ±5%, 2W, 200V, ±200ppm/℃, SMD 2512; Manufacturer: Uniroyal; Manufacturer Part Number: FRP2512J130 TS; Supplier 1: LCSC; Supplier Part Number 1: C3013386; JLCPCB Part Number: C3013386; Power Rating: 2W; Category: Resistors; Package Size: 2512; JLCPCB Basic Part: Yes; Tolerance: ±5%; Voltage Rating: 200V; Temperature Coefficient: ±200ppm/℃; ComponentLink1Description: Datasheet; ComponentLink1URL: https://wmsc.lcsc.com/wmsc/upload/file/pdf/v2/lcsc/2308241947_FOJAN-FRP2512J130-TS_C3013386.pdf; ComponentLink2Description: JLCPCB Part URL; ComponentLink2URL: https://jlcpcb.com/partdetail/C3013386
pins: 1, 2
1 alternate drawing of the same symbol

## FRP2512J150 TS
designator R?  Resistance: 15Ω  (hidden comment: *)
Resistor, 15Ω, ±5%, 2W, ±200ppm/℃, SMD 2512; Manufacturer: Uniroyal; Manufacturer Part Number: FRP2512J150 TS; Supplier 1: LCSC; Supplier Part Number 1: C5713426; JLCPCB Part Number: C5713426; Power Rating: 2W; Category: Resistors; Package Size: 2512; JLCPCB Basic Part: Yes; Tolerance: ±5%; Temperature Coefficient: ±200ppm/℃; ComponentLink1Description: Datasheet; ComponentLink1URL: https://wmsc.lcsc.com/wmsc/upload/file/pdf/v2/lcsc/2308241947_FOJAN-FRP2512J150-TS_C5713426.pdf; ComponentLink2Description: JLCPCB Part URL; ComponentLink2URL: https://jlcpcb.com/partdetail/C5713426
pins: 1, 2
1 alternate drawing of the same symbol

## FRP2512J330 TS
designator R?  Resistance: 33Ω  (hidden comment: *)
Resistor, 33Ω, ±5%, 2W, 200V, ±200ppm/℃, SMD 2512; Manufacturer: Uniroyal; Manufacturer Part Number: FRP2512J330 TS; Supplier 1: LCSC; Supplier Part Number 1: C5713429; JLCPCB Part Number: C5713429; Power Rating: 2W; Category: Resistors; Package Size: 2512; JLCPCB Basic Part: Yes; Tolerance: ±5%; Voltage Rating: 200V; Temperature Coefficient: ±200ppm/℃; ComponentLink1Description: Datasheet; ComponentLink1URL: https://wmsc.lcsc.com/wmsc/upload/file/pdf/v2/lcsc/2308241947_FOJAN-FRP2512J330-TS_C5713429.pdf; ComponentLink2Description: JLCPCB Part URL; ComponentLink2URL: https://jlcpcb.com/partdetail/C5713429
pins: 1, 2
1 alternate drawing of the same symbol

## FRP2512J331TS
designator R?  Resistance: 330Ω  (hidden comment: *)
Resistor, 330Ω, ±5%, SMD 2512; Manufacturer: Uniroyal; Manufacturer Part Number: FRP2512J331TS; Supplier 1: LCSC; Supplier Part Number 1: C3000660; JLCPCB Part Number: C3000660; Category: Resistors; Package Size: 2512; JLCPCB Basic Part: Yes; Tolerance: ±5%; ComponentLink1Description: Datasheet; ComponentLink1URL: https://wmsc.lcsc.com/wmsc/upload/file/pdf/v2/lcsc/2308241947_FOJAN-FRP2512J331TS_C3000660.pdf; ComponentLink2Description: JLCPCB Part URL; ComponentLink2URL: https://jlcpcb.com/partdetail/C3000660
pins: 1, 2
1 alternate drawing of the same symbol

## FRP2512J470 TS
designator R?  Resistance: 47Ω  (hidden comment: *)
Resistor, 47Ω, ±5%, 2W, 200V, ±200ppm/℃, SMD 2512; Manufacturer: Uniroyal; Manufacturer Part Number: FRP2512J470 TS; Supplier 1: LCSC; Supplier Part Number 1: C3013388; JLCPCB Part Number: C3013388; Power Rating: 2W; Category: Resistors; Package Size: 2512; JLCPCB Basic Part: Yes; Tolerance: ±5%; Voltage Rating: 200V; Temperature Coefficient: ±200ppm/℃; ComponentLink1Description: Datasheet; ComponentLink1URL: https://wmsc.lcsc.com/wmsc/upload/file/pdf/v2/lcsc/2308241947_FOJAN-FRP2512J470-TS_C3013388.pdf; ComponentLink2Description: JLCPCB Part URL; ComponentLink2URL: https://jlcpcb.com/partdetail/C3013388
pins: 1, 2
1 alternate drawing of the same symbol
